# Altium integrated library Mastermind.IntLib: 985 symbols (part 3 of 6)
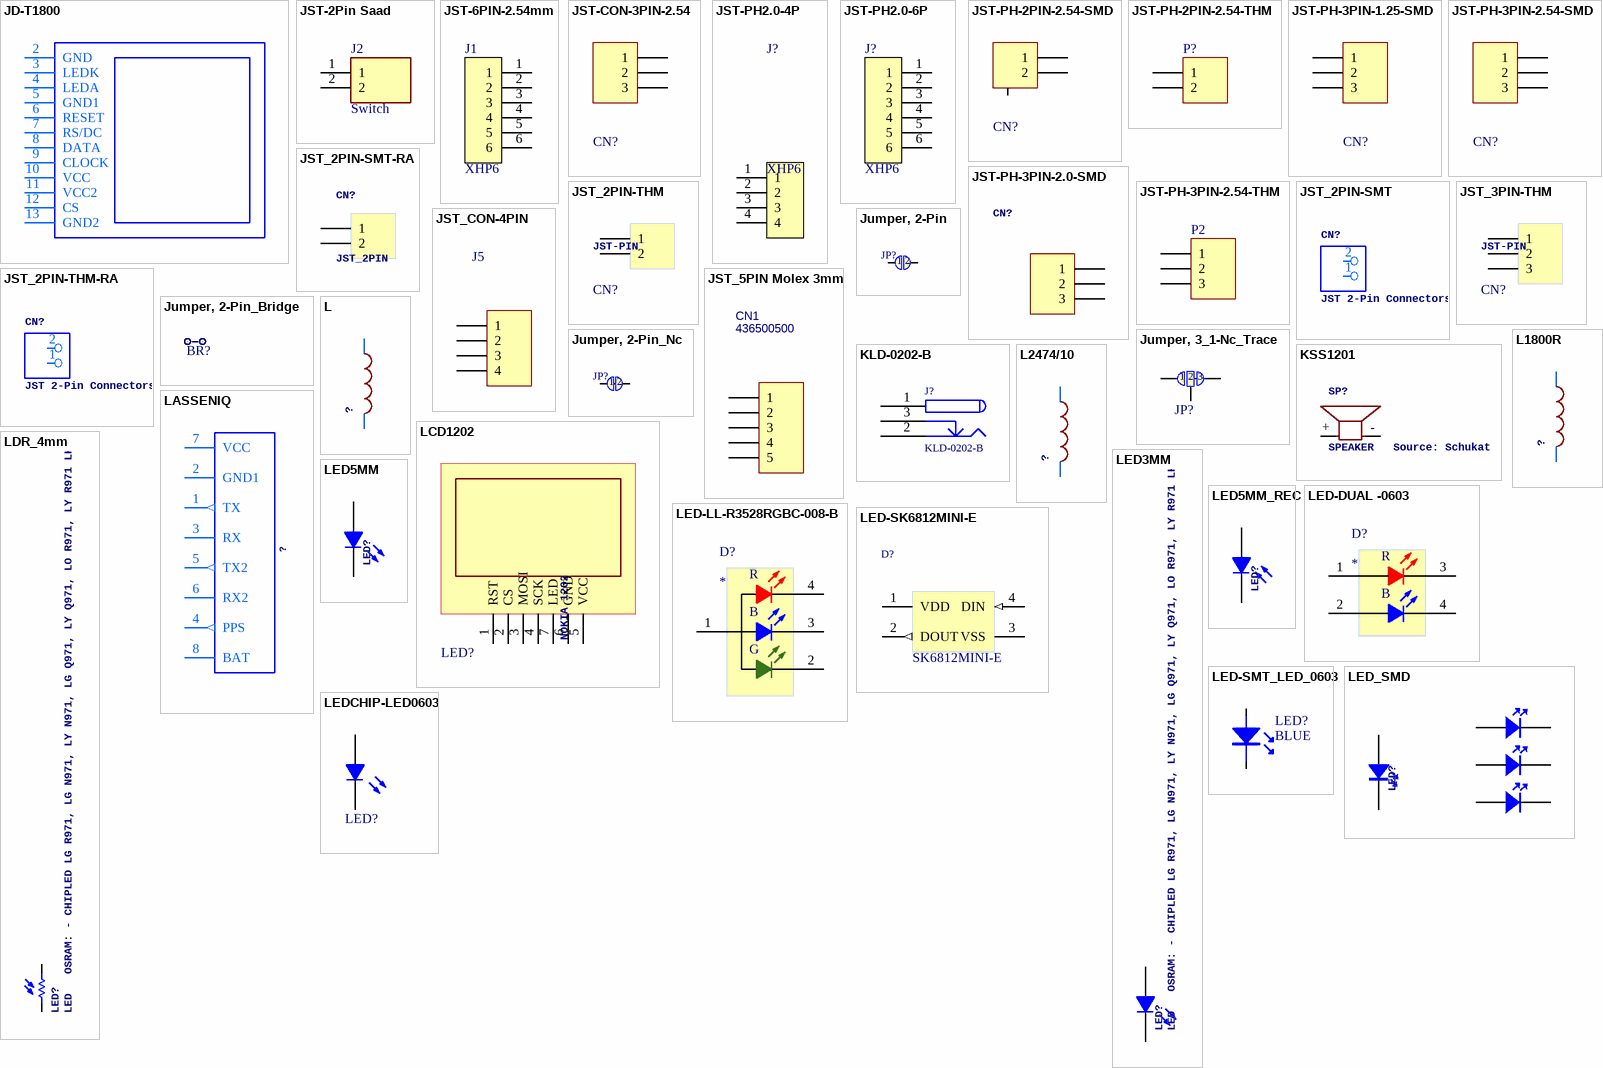
[diagram p42: symbols JD-T1800 to LEDCHIP-LED0603]

## Jumper, 2-Pin_Bridge
designator BR?  (value not drawn)  (no BOM)
Jumper, 2-Pin
signal-integrity model Connector
footprint JUMPER-NT
pins: 1, 2

## Jumper, 2-Pin_Nc
designator JP?, comment Shorting Link  (value not drawn)  (no BOM)
Jumper, 2-Pin
footprint Jumper-NC
pins: 1, 2

## Jumper, 3_1-Nc_Trace
designator JP?, comment JUMPER-SMT_3_1-NC_TRACE_NO-SILK  (value not drawn)  (no BOM)
GateName_1: G$1; SymbolName_1: SMT-JUMPER_3_1-NC_TRACE; DeviceName: _NO-SILK; LibraryName: SparkFun-Jumpers; DeviceSetName: JUMPER-SMT_3_1-NC_TRACE
footprint JUMPER_3_2-NC_TRACE_SILK (SMT-JUMPER_3_2-NC_TRACE_SILK)
pins: 1, 2, 3

## KLD-0202-B
designator J?
Low Voltage Power Supply Connector; Manufacturer: Kycon; AEMS Code: 3510211
3D model power_jack (PCB3D Model)
footprint KLD-0202
pins: 1 (power), 2 (power), 3 (power)

## KSS1201
designator SP?, comment SPEAKER   Source: Schukat
OC_FARNELL: unknown; OC_NEWARK: unknown
footprint KSS1201
pins: + 1, - 2

## L
designator ?
footprint 6000
pins: 1, 2

## L1800R
designator ?
footprint 1800R
pins: 1, 2

## L2474/10
designator ?
footprint 2747
pins: P$1 1, P$2 2

## LASSENIQ
designator ?
footprint TRIMBLE
pins: 1 TX (out), 2 GND1 (oe), 3 RX, 4 PPS (out), 5 TX2 (out), 6 RX2, 7 VCC (oe), 8 BAT (oe)

## LCD1202
designator LED?, comment NOKIA 1202
footprint LCD1202
pins: 1 RST, 2 CS, 3 MOSI, 4 SCK, 5 VCC, 6 GND, 7 LED

## LDR_4mm
designator LED?, comment LED   OSRAM: - CHIPLED LG R971, LG N971, LY N971, LG Q971, LY Q971, LO R971, LY R971 LH N974, LH R974 LS Q976, LO Q976, LY Q976 LO Q996 - Hyper CHIPLED LW Q18S LB Q993, LB Q99A, LB R99A - SideLED LS A670, LO A670, LY A670, LG A670, LP A670 LB A673, LV A673, LT A673, LW A673 LH A674 LY A675 LS A676, LA A676, LO A676, LY A676, LW A676 LS A679, LY A679, LG A679 -  Hyper Micro SIDELEDÂ® LS Y876, LA Y876, LO Y876, LY Y876 LT Y87S - SmartLED LW L88C, LW L88S LB L89C, LB L89S, LG L890 LS L89K, LO L89K, LY L89K LS L896, LA L896, LO L896, LY L896 - TOPLED LS T670, LO T670, LY T670, LG T670, LP T670 LSG T670, LSP T670, LSY T670, LOP T670, LYG T670 LG T671, LOG T671, LSG T671 LB T673, LV T673, LT T673, LW T673 LH T674 LS T676, LA T676, LO T676, LY T676, LB T676, LH T676, LSB T676, LW T676 LB T67C, LV T67C, LT T67C, LS T67K, LO T67K, LY T67K, LW E67C LS E67B, LA E67B, LO E67B, LY E67B, LB E67C, LV E67C, LT E67C LW T67C LS T679, LY T679, LG T679 LS T770, LO T770, LY T770, LG T770, LP T770 LB T773, LV T773, LT T773, LW T773 LH T774 LS E675, LA E675, LY E675, LS T675 LS T776, LA T776, LO T776, LY T776, LB T776 LHGB T686 LT T68C, LB T68C - Hyper Mini TOPLEDÂ® LB M676 - Mini TOPLED SantanaÂ® LG M470 LS M47K, LO M47K, LY M47K    Source: http://www.osram.convergy.de/
footprint LDR-4mm
pins: 1, 2

## LED3MM
designator LED?, comment LED   OSRAM: - CHIPLED LG R971, LG N971, LY N971, LG Q971, LY Q971, LO R971, LY R971 LH N974, LH R974 LS Q976, LO Q976, LY Q976 LO Q996 - Hyper CHIPLED LW Q18S LB Q993, LB Q99A, LB R99A - SideLED LS A670, LO A670, LY A670, LG A670, LP A670 LB A673, LV A673, LT A673, LW A673 LH A674 LY A675 LS A676, LA A676, LO A676, LY A676, LW A676 LS A679, LY A679, LG A679 -  Hyper Micro SIDELEDÂ® LS Y876, LA Y876, LO Y876, LY Y876 LT Y87S - SmartLED LW L88C, LW L88S LB L89C, LB L89S, LG L890 LS L89K, LO L89K, LY L89K LS L896, LA L896, LO L896, LY L896 - TOPLED LS T670, LO T670, LY T670, LG T670, LP T670 LSG T670, LSP T670, LSY T670, LOP T670, LYG T670 LG T671, LOG T671, LSG T671 LB T673, LV T673, LT T673, LW T673 LH T674 LS T676, LA T676, LO T676, LY T676, LB T676, LH T676, LSB T676, LW T676 LB T67C, LV T67C, LT T67C, LS T67K, LO T67K, LY T67K, LW E67C LS E67B, LA E67B, LO E67B, LY E67B, LB E67C, LV E67C, LT E67C LW T67C LS T679, LY T679, LG T679 LS T770, LO T770, LY T770, LG T770, LP T770 LB T773, LV T773, LT T773, LW T773 LH T774 LS E675, LA E675, LY E675, LS T675 LS T776, LA T776, LO T776, LY T776, LB T776 LHGB T686 LT T68C, LB T68C - Hyper Mini TOPLEDÂ® LB M676 - Mini TOPLED SantanaÂ® LG M470 LS M47K, LO M47K, LY M47K    Source: http://www.osram.convergy.de/
footprint LED3MM
pins: A, K

## LED5MM
designator LED?
footprint LED5MM
footprint LED5MM1
pins: A, K

## LED5MM_REC
designator LED?
footprint LED5MM
footprint LED5MM1
pins: A, K

## LED-DUAL -0603
designator D?
0603 1.6*1.5mm; MF: Lucky Light; MP: LL-R3528RGBC-008-B; Package: PLCC-2 Lucky Light; Availability: Unavailable; Value: *; SnapEDA_Link: https://www.snapeda.com/parts/LL-R3528RGBC-008-B/Lucky%20Light/view-part/47649/?ref=snap; Price: None
footprint LED_DUAL_0606 - touch
footprint LED_DUAL_0606
pins: 1 A, 2 A, 3 K, 4 K
text: R; B

## LED-LL-R3528RGBC-008-B
designator D?
LED; SMD; 3528, PLCC2; RGB; 3.5x2.8mm; 120Â°; Red lumin: 1; MF: Lucky Light; MP: LL-R3528RGBC-008-B; Package: PLCC-2 Lucky Light; Availability: Unavailable; Value: *; SnapEDA_Link: https://www.snapeda.com/parts/LL-R3528RGBC-008-B/Lucky%20Light/view-part/47649/?ref=snap; Price: None
footprint LED_LL-R3528RGBC-008-B
pins: 1 A, 2 K, 3 K, 4 K
text: R; B; G

## LED-SK6812MINI-E
designator D?  Name: SK6812MINI-E
SMD RGB LED
footprint LED_SK6812MINI-E
pins: 1 VDD, 2 DOUT (out), 3 VSS, 4 DIN (in)

## LED-SMT_LED_0603
designator LED?, comment BLUE
SMT LED
footprint CHIPLED_0603
pins: A, C K

## LED_SMD
designator LED?, comment LED   OSRAM: - CHIPLED LG R971, LG N971, LY N971, LG Q971, LY Q971, LO R971, LY R971 LH N974, LH R974 LS Q976, LO Q976, LY Q976 LO Q996 - Hyper CHIPLED LW Q18S LB Q993, LB Q99A, LB R99A - SideLED LS A670, LO A670, LY A670, LG A670, LP A670 LB A673, LV A673, LT A673, LW A673 LH A674 LY A675 LS A676, LA A676, LO A676, LY A676, LW A676 LS A679, LY A679, LG A679 -  Hyper Micro SIDELEDÂ® LS Y876, LA Y876, LO Y876, LY Y876 LT Y87S - SmartLED LW L88C, LW L88S LB L89C, LB L89S, LG L890 LS L89K, LO L89K, LY L89K LS L896, LA L896, LO L896, LY L896 - TOPLED LS T670, LO T670, LY T670, LG T670, LP T670 LSG T670, LSP T670, LSY T670, LOP T670, LYG T670 LG T671, LOG T671, LSG T671 LB T673, LV T673, LT T673, LW T673 LH T674 LS T676, LA T676, LO T676, LY T676, LB T676, LH T676, LSB T676, LW T676 LB T67C, LV T67C, LT T67C, LS T67K, LO T67K, LY T67K, LW E67C LS E67B, LA E67B, LO E67B, LY E67B, LB E67C, LV E67C, LT E67C LW T67C LS T679, LY T679, LG T679 LS T770, LO T770, LY T770, LG T770, LP T770 LB T773, LV T773, LT T773, LW T773 LH T774 LS E675, LA E675, LY E675, LS T675 LS T776, LA T776, LO T776, LY T776, LB T776 LHGB T686 LT T68C, LB T68C - Hyper Mini TOPLEDÂ® LB M676 - Mini TOPLED SantanaÂ® LG M470 LS M47K, LO M47K, LY M47K    Source: http://www.osram.convergy.de/  (value not drawn)
footprint CHIPLED_0603
pins: A, A, A, A, C K, C K, C K, C K

## LEDCHIP-LED0603
designator LED?, comment LED  (value not drawn)
SMD lamp beads
footprint CHIP-LED0603
footprint CHIPLED_0603
footprint KA-3528ASYC
footprint CHIPLED_0603 - NO
pins: A, C K

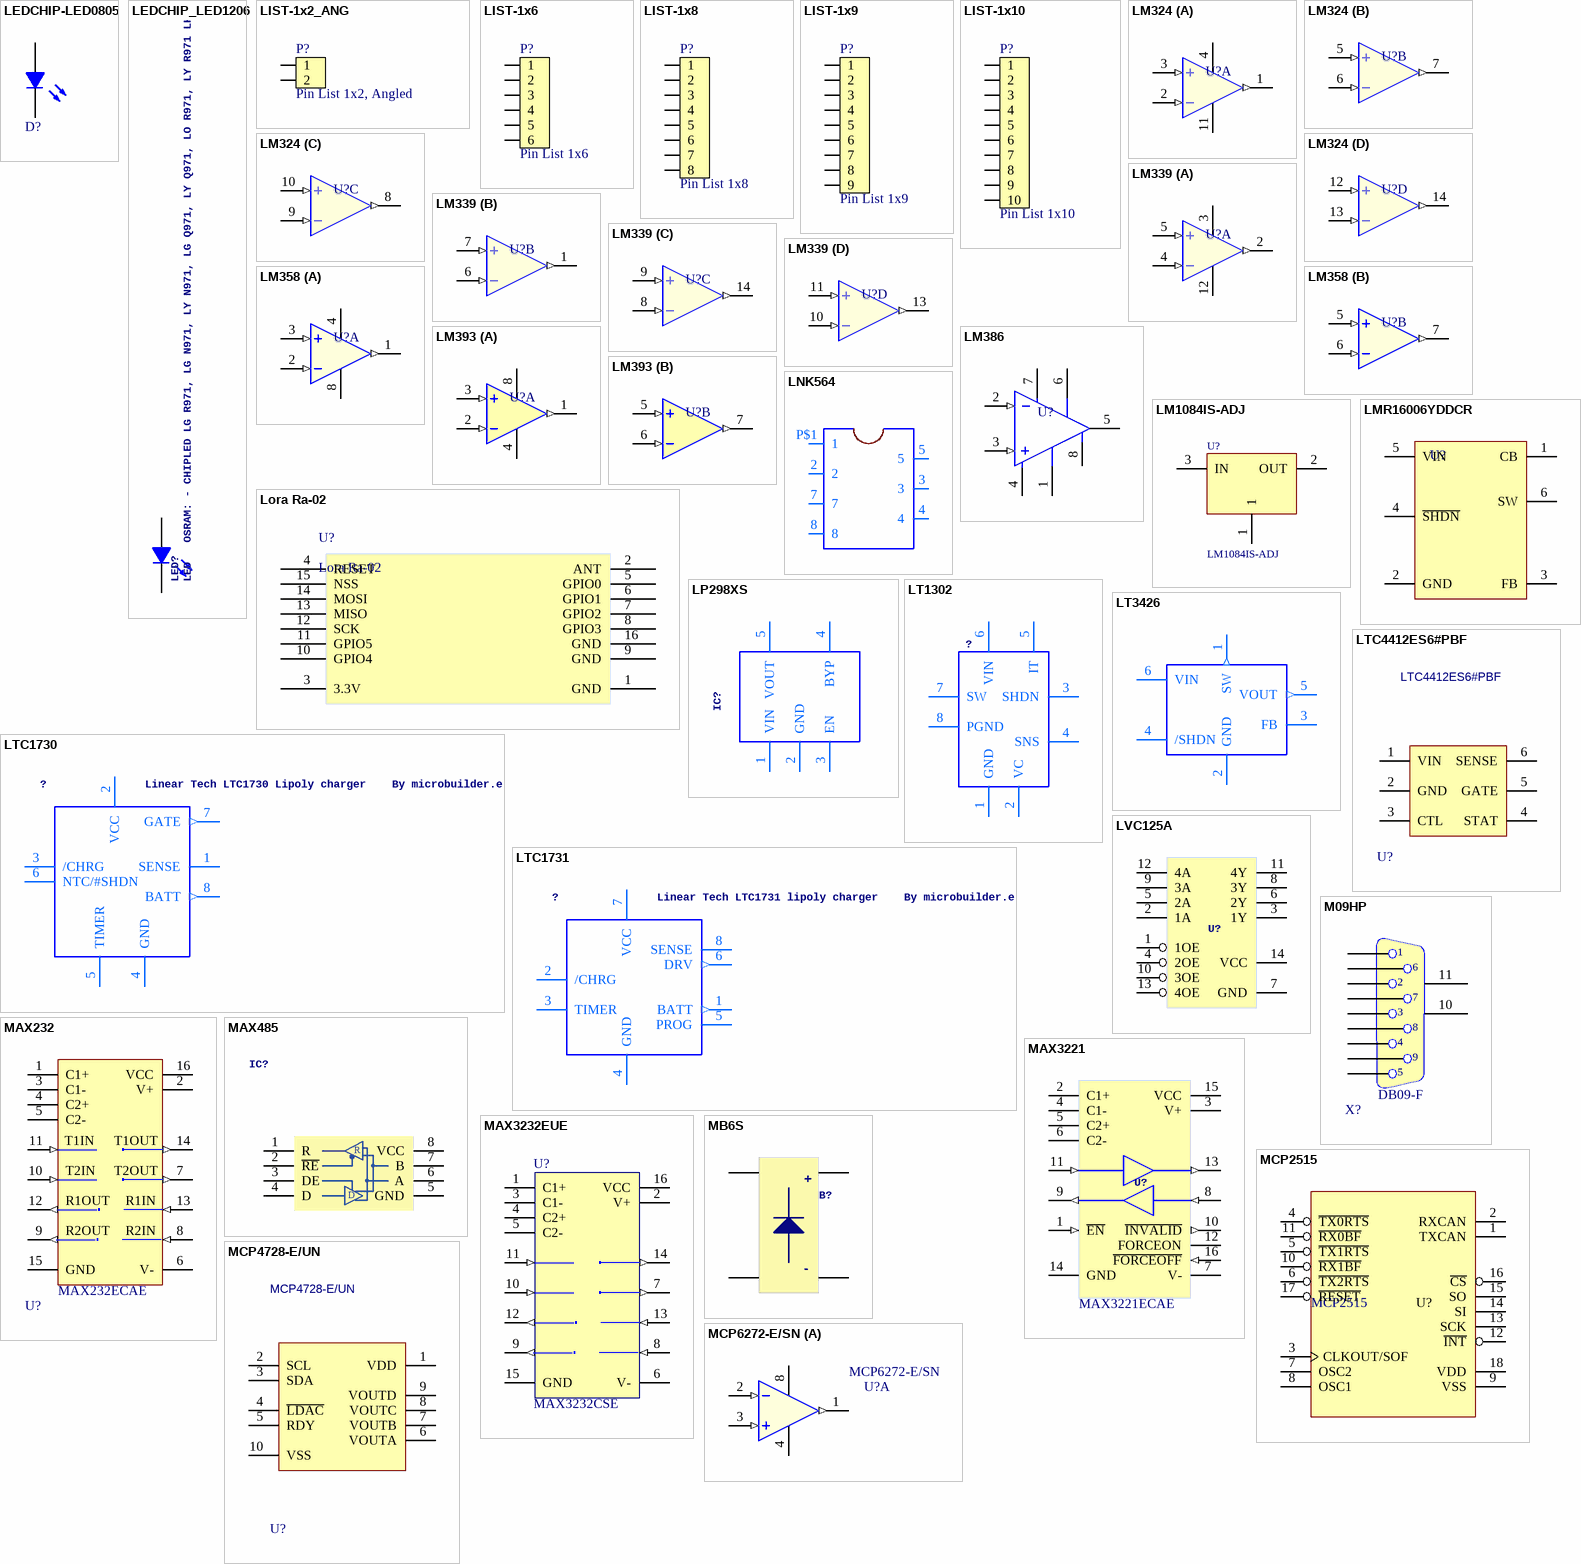
[diagram p16: symbols LEDCHIP-LED0805 to MCP6272-E/SN]

## LEDCHIP-LED0805
designator D?  (value not drawn)
SMD Lamp beads
footprint CHIP-LED0805
footprint CHIP-LED0805-NO
pins: A, C

## LEDCHIP_LED1206
designator LED?, comment LED   OSRAM: - CHIPLED LG R971, LG N971, LY N971, LG Q971, LY Q971, LO R971, LY R971 LH N974, LH R974 LS Q976, LO Q976, LY Q976 LO Q996 - Hyper CHIPLED LW Q18S LB Q993, LB Q99A, LB R99A - SideLED LS A670, LO A670, LY A670, LG A670, LP A670 LB A673, LV A673, LT A673, LW A673 LH A674 LY A675 LS A676, LA A676, LO A676, LY A676, LW A676 LS A679, LY A679, LG A679 -  Hyper Micro SIDELEDÂ® LS Y876, LA Y876, LO Y876, LY Y876 LT Y87S - SmartLED LW L88C, LW L88S LB L89C, LB L89S, LG L890 LS L89K, LO L89K, LY L89K LS L896, LA L896, LO L896, LY L896 - TOPLED LS T670, LO T670, LY T670, LG T670, LP T670 LSG T670, LSP T670, LSY T670, LOP T670, LYG T670 LG T671, LOG T671, LSG T671 LB T673, LV T673, LT T673, LW T673 LH T674 LS T676, LA T676, LO T676, LY T676, LB T676, LH T676, LSB T676, LW T676 LB T67C, LV T67C, LT T67C, LS T67K, LO T67K, LY T67K, LW E67C LS E67B, LA E67B, LO E67B, LY E67B, LB E67C, LV E67C, LT E67C LW T67C LS T679, LY T679, LG T679 LS T770, LO T770, LY T770, LG T770, LP T770 LB T773, LV T773, LT T773, LW T773 LH T774 LS E675, LA E675, LY E675, LS T675 LS T776, LA T776, LO T776, LY T776, LB T776 LHGB T686 LT T68C, LB T68C - Hyper Mini TOPLEDÂ® LB M676 - Mini TOPLED SantanaÂ® LG M470 LS M47K, LO M47K, LY M47K    Source: http://www.osram.convergy.de/
footprint CHIPLED_1206
pins: A, C

## LIST-1x2_ANG
designator P?, comment Pin List 1x2, Angled
Pin List 1x2, 2.54mm (100mil), Right Angled, SMD; Part Number: Pin List Ang 1x2 SMD, 2.54mm; Manufacturer: W-CON; Manufacturer Part Number: 1125B-1102S0ZZ135R1; 2nd source part number: TSM-102-01-L-SH-A; Artikkelnr Noca: 55010023; Artikkelnr Simpro: N.A.; Datasheet: \\hizz\pro\app9717\Datasheet\connectores\W-CON\1125B-11XXXXZXXXXX.pdf; Footprint Doc: LIST_ANG_1x2-SMD-2.54MM; LatestRevisionDate: 2016-01-22; Pin Count: 2; Publisher: Nordic Semiconductor; Published: 2016-01-22; Value: Pin List 1x2, Angled; Note: *; Supplier: Cabcon; Supplier part number: 1125B-1102S0ZZ135R1; 2nd source Supplier: Samtec
footprint LIST_ANG_1x2-SMD-2.54MM
pins: 1, 2

## LIST-1x6
designator P?, comment Pin List 1x6
Pin List 1x6, 2.54mm (100mil), SMD; Part Number: Pin List 1x6 SMD; Note: Not mounted; Artikkelnr Noca: 55019252; Artikkelnr Simpro: N.A.; Manufacturer: *; Manufacturer Part Number: *; Datasheet: *; LatestRevisionDate: 2013-08-27; Pin Count: 6; Publisher: Nordic Semiconductor; Published: 2013-08-27; Value: Pin List 1x6; Supplier: Samtec; Supplier part number: TSM-106-01-L-SV-P-TR; 2nd source Supplier: *; 2nd source part number: *; Footprint Doc: LIST_1x6_SMD
footprint LIST_1x6_SMD
pins: 1, 2, 3 (power), 4 (power), 5 (power), 6 (power)

## LIST-1x8
designator P?, comment Pin List 1x8
Pin List 1x8, 2.54mm (100mil), SMD; Part Number: Pin List 1x8 SMD; Note: Not mounted; Artikkelnr Noca: 55019253; Artikkelnr Simpro: N.A.; Manufacturer: *; Manufacturer Part Number: *; Datasheet: *; LatestRevisionDate: 2013-08-27; Publisher: Nordic Semiconductor; Published: 2013-08-27; Value: Pin List 1x8; Supplier: Samtec; Supplier part number: TSM-108-01-L-SV-P-TR; 2nd source Supplier: *; 2nd source part number: *; Pin Count: 8; Footprint Doc: LIST_1x8_SMD
footprint LIST_1x8_SMD
pins: 1, 2, 3 (power), 4 (power), 5 (power), 6 (power), 7 (power), 8 (power)

## LIST-1x9
designator P?, comment Pin List 1x9
Pin List 1x9, 2.54mm (100mil), SMD; Part Number: Pin List 1x9 SMD; Artikkelnr Noca: N.A.; Manufacturer: *; Manufacturer Part Number: *; Datasheet: *; Footprint Doc: LIST_1x9_SMD; LatestRevisionDate: 2014-06-10; Pin Count: 9; Publisher: Nordic Semiconductor; Published: 2014-06-10; Value: Pin List 1x9; Note: *; Supplier: Samtec; Supplier part number: TSM-109-01-L-SV-P-TR; 2nd source Supplier: *; 2nd source part number: *; Artikkelnr Simpro: N.A.
footprint LIST_1x9_SMD
pins: 1, 2, 3 (power), 4 (power), 5 (power), 6 (power), 7 (power), 8 (power), 9 (power)

## LIST-1x10
designator P?, comment Pin List 1x10
Pin List 1x10, 2.54mm (100mil), SMD; Part Number: Pin List 1x10 SMD; Note: Not mounted; Artikkelnr Noca: 55019254; Artikkelnr Simpro: N.A.; Manufacturer: *; Manufacturer Part Number: *; Datasheet: *; LatestRevisionDate: 2013-08-27; Publisher: Nordic Semiconductor; Published: 2013-08-27; Value: Pin List 1x10; Supplier: Samtec; Supplier part number: TSM-110-01-L-SV-P-TR; 2nd source Supplier: *; 2nd source part number: *; Pin Count: 10; Footprint Doc: LIST_1x10_SMD
footprint LIST_1x10_SMD
pins: 1, 2, 3, 4, 5, 6, 7, 8, 9, 10

## LM324
designator U?  (value not drawn)
Four channels 15nA 0.5V/us 1.2MHz SOIC-14 Operational Amplifier ROHS
footprint TSSOP14
footprint SOIC127P600X175-14N
part A pins: 1 OA (out), 2 A- (in), 3 A+ (in), 4 VCC, 11 GND
part B pins: 5 B+ (in), 6 B- (in), 7 OB (out)
part C pins: 8 OC (out), 9 C- (in), 10 C+ (in)
part D pins: 12 D+ (in), 13 D- (in), 14 OD (out)

## LM339
designator U?, comment National LM3622 li-ion charger    http://www.ladyada.net/library/eagle  (value not drawn)
footprint TSSOP14
part A pins: 2 OA (out), 3 VCC, 4 A- (in), 5 A+ (in), 12 GND
part B pins: 1 OB (out), 6 B- (in), 7 B+ (in)
part C pins: 8 C- (in), 9 C+ (in), 14 OC (out)
part D pins: 10 D- (in), 11 D+ (in), 13 OD (out)

## LM358
designator U?  (value not drawn)
Dual Operational Amplifiers
footprint SOIC-8E (SOIC, 8-Leads, Body 4.90x3.90mm, Pitch 1.27mm, IPC Medium Density)
footprint DIL08-ROUND
part A pins: 1 OA (out), 2 A- (in), 3 A+ (in), 4 GND, 8 VCC
part B pins: 5 B+ (in), 6 B- (in), 7 OB (out)

## LM386
designator U?  (value not drawn)
Audio Amplifiers
footprint SOIC-8E (SOIC, 8-Leads, Body 4.90x3.90mm, Pitch 1.27mm, IPC Medium Density)
footprint DIL08-ROUND
pins: 1 OA, 2 A- (in), 3 A+ (in), 4 GND, 5 VCC, 6 VCC, 7 VCC, 8 VCC

## LM393
designator U?, comment LM393 OP AMP  (value not drawn)
Operational Amplifier
footprint SOP8
footprint DIL08-ROUND
part A pins: 1 OA (out), 2 A- (in), 3 A+ (in), 4 GND, 8 VCC
part B pins: 5 B+ (in), 6 B- (in), 7 OB (out)

## LM1084IS-ADJ
designator U?
5A Low Dropout Possitive Regulators
footprint TO-263
3D model to263 (PCB3D Model)
pins: 1 "Output", 2 OUT (power) "Output", 3 IN (power) "Input"

## LMR16006YDDCR
designator U?  (value not drawn)
BOM_Manufacturer: TI(Tex as Instruments); Contributor: LCSC; BOM_Supplier: LCSC; BOM_Supplier Part: C290195; BOM_Manufacturer Part: LMR16006YDDCR; BOM_JLCPCB Part Class: Extended Part; spicePre: U; spiceSymbolName: LMR16006YDDCR
footprint SOT23-6
pins: 1 CB, 2 GND, 3 FB, 4 ~{SHDN}, 5 VIN, 6 SW

## LNK564
designator ?
footprint LNKPACKAGE
pins: 2, 3, 4, 5, 7, 8, P$1 1

## Lora Ra-02
designator U?
Lora Technology; IC: ESP8266-EX; Vendor: Ai-thinker; LatestReviewer: Zion Blue; Published: 14-Apr-2015; Publisher: Cynetik Group; LatestRevisionData: 14-Apr-2015; LatestRevisionNote: Include 3D body and Footprint
footprint Ra-02 (Lora module)
pins: 1 GND "Reset", 2 ANT "ADC Input Or TOUT Output", 3 3.3V "Chip enable", 4 RESET "GPIO16 or Deep-Sleep Wakeup", 5 GPIO0 "GPIO14 or SPI CLK", 6 GPIO1 "GPIO12 or SPIQ", 7 GPIO2 "GPIO13 or SPID", 8 GPIO3 "Power supply", 9 GND "Power ground", 10 GPIO4 "GPIO15 or SPICS", 11 GPIO5 "GPIO2 or TX", 12 SCK "GPIO0 or SPICS2", 13 MISO "GPIO5", 14 MOSI "GPIO4", 15 NSS "GPIO3 or UART RXD", 16 GND "GPIO1 or UART TXD"

## LP298XS
designator IC?
footprint SOT23-5L
pins: 1 VIN, 2 GND, 3 EN, 4 BYP, 5 VOUT

## LT1302
designator ?
footprint DIL08
pins: 1 GND, 2 VC, 3 SHDN, 4 SNS, 5 IT, 6 VIN, 7 SW, 8 PGND

## LT3426
designator ?, comment LT3426   1.2MHz, 2A boost converter in SOT-23    http://www.linear.com/pc/productDetail.jsp?navId=H0,C1,C1003,C1042,C1031,C1061,P8430 (Linear website)  (value not drawn)
footprint SOT23-6
pins: 1 SW (out), 2 GND (oe), 3 FB, 4 /SHDN, 5 VOUT (out), 6 VIN

## LTC1730
designator ?, comment Linear Tech LTC1730 Lipoly charger    By microbuilder.eu
footprint SO08
pins: 1 SENSE, 2 VCC (oe), 3 /CHRG, 4 GND (oe), 5 TIMER, 6 NTC/#SHDN, 7 GATE (out), 8 BATT (out)

## LTC1731
designator ?, comment Linear Tech LTC1731 lipoly charger    By microbuilder.eu
footprint SO08
pins: 1 BATT (out), 2 /CHRG, 3 TIMER, 4 GND (oe), 5 PROG, 6 DRV (out), 7 VCC (oe), 8 SENSE

## LTC4412ES6#PBF
designator U?
Manufacturer: ADI(亚德诺); Supplier: LCSC; Manufacturer Part: LTC4412ES6#PBF; Supplier Part: C107968; JLCPCB Part Class: Extended Part; spicePre: U; spiceSymbolName: LTC4412ES6#PBF
footprint SOT23-6
pins: 1 VIN, 2 GND, 3 CTL, 4 STAT, 5 GATE, 6 SENSE

## LVC125A
designator U?, comment Quad_shift_level_ic  (value not drawn)
74VHC125MCT
footprint TSSOP14
pins: 1 1OE, 2 1A, 3 1Y, 4 2OE, 5 2A, 6 2Y, 7 GND, 8 3Y, 9 3A, 10 3OE, 11 4Y, 12 4A, 13 4OE, 14 VCC

## M09HP
designator X?, comment SUB-D  (value not drawn)
GateName_1: G$1; SymbolName_1: F09; DeviceName: H; LibraryName: con-subd; DeviceSetName: F09; Package: F09H; OC_FARNELL: unknown; OC_NEWARK: unknown
footprint M09HP
pins: 1, 2, 3, 4, 5, 6, 7, 8, 9, 10 1, 11 1
text: DB09-F

## MAX232
designator U?, comment SymbolName_1: MAX232ECAE  (hidden comment: RS232 TRANSCEIVER)
GateName_1: G$1
footprint SO-16
pins: 1 C1+, 2 V+ (power), 3 C1-, 4 C2+, 5 C2-, 6 V- (power), 7 T2OUT (out), 8 R2IN (in), 9 R2OUT (out), 10 T2IN (in), 11 T1IN (in), 12 R1OUT (out), 13 R1IN (in), 14 T1OUT (out), 15 GND (power), 16 VCC (power)

## MAX485
designator IC?  (value not drawn)
RS-485/RS-422 ICs ROHS
footprint SOP8
pins: 1 R, 2 ~{RE}, 3 DE, 4 D, 5 GND (power), 6 A, 7 B (power), 8 VCC (power)

## MAX3221
designator U?, comment SymbolName_1: MAX3221ECAE  (hidden comment: RS232 TRANSCEIVER)
GateName_1: G$1
footprint SSOP16
pins: 1 ~{EN} (in), 2 C1+, 3 V+, 4 C1-, 5 C2+, 6 C2-, 7 V-, 8 (in), 9 (out), 10 ~{INVALID} (out), 11 (in), 12 FORCEON, 13 (out), 14 GND, 15 VCC, 16 ~{FORCEOFF} (in)

## MAX3232EUE
designator U?, comment MAX3232CSE
3.0V TO 5.5V, Low-Power, up to 1Mbps, True RS-232 Transceiver Using Four 0.1µF External Capacitor; Manufacturer: Maxim,ST; Package Information: Latest Revision: 21-0066 C; Class I: Communication; Published: 16-Jan-2001; Revision: July-2002: Re-released for DXP Platform.; Datasheet: Latest Revision: Mar-1999; Package Reference: TSSOP16; Publisher: Altium Limited; Class II: Transceiver; Fitted: True
footprint SO-16
pins: 1 C1+, 2 V+ (power), 3 C1-, 4 C2+, 5 C2-, 6 V- (power), 7 T2OUT (out), 8 R2IN (in), 9 R2OUT (out), 10 T2IN (in), 11 T1IN (in), 12 R1OUT (out), 13 R1IN (in), 14 T1OUT (out), 15 GND (power), 16 VCC (power)

## MB6S
designator B?
footprint MBS
pins: +, -, AC1, AC2

## MCP2515
designator U?
CAN Controller; Manufacturer: Tokmas(托克马斯); Symbol: MCP2515-I; Add into BOM: yes; Device: MCP2515-I; Supplier: LCSC; Supplier Part: C5250735; Manufacturer Part: MCP2515-I; JLCPCB Part Class: Extended Part; LCSC Part Name: CAN芯片; Supplier Footprint: TSSOP-20; Datasheet: https://atta.szlcsc.com/upload/public/pdf/source/20221108/54102364C5045B746FF767DA10992A5D.pdf; Convert to PCB: yes
footprint SOIC-18_L11.6-W7.5-P1.27-LS10.3-BL
pins: 1 TXCAN, 2 RXCAN, 3 CLKOUT/SOF, 4 ~{TX0RTS}, 5 ~{TX1RTS}, 6 ~{TX2RTS}, 7 OSC2, 8 OSC1, 9 VSS, 10 ~{RX1BF}, 11 ~{RX0BF}, 12 ~{INT}, 13 SCK, 14 SI, 15 SO, 16 ~{CS}, 17 ~{RESET}, 18 VDD

## MCP4728-E/UN
designator U?
12Bit MSOP-10 Digital To Analog Converters (DACs); Manufacturer: MICROCHIP(美国微芯); Contributor: LCSC; Supplier: LCSC; Supplier Part: C108207; Manufacturer Part: MCP4728-E/UN; JLCPCB Part Class: Extended Part; spicePre: U; spiceSymbolName: MCP4728-E/UN
footprint MSOP-10_L3.0-W3.0-P0.50-LS5.0-TL
pins: 1 VDD, 2 SCL, 3 SDA, 4 ~{LDAC}, 5 RDY, 6 VOUTA, 7 VOUTB, 8 VOUTC, 9 VOUTD, 10 VSS

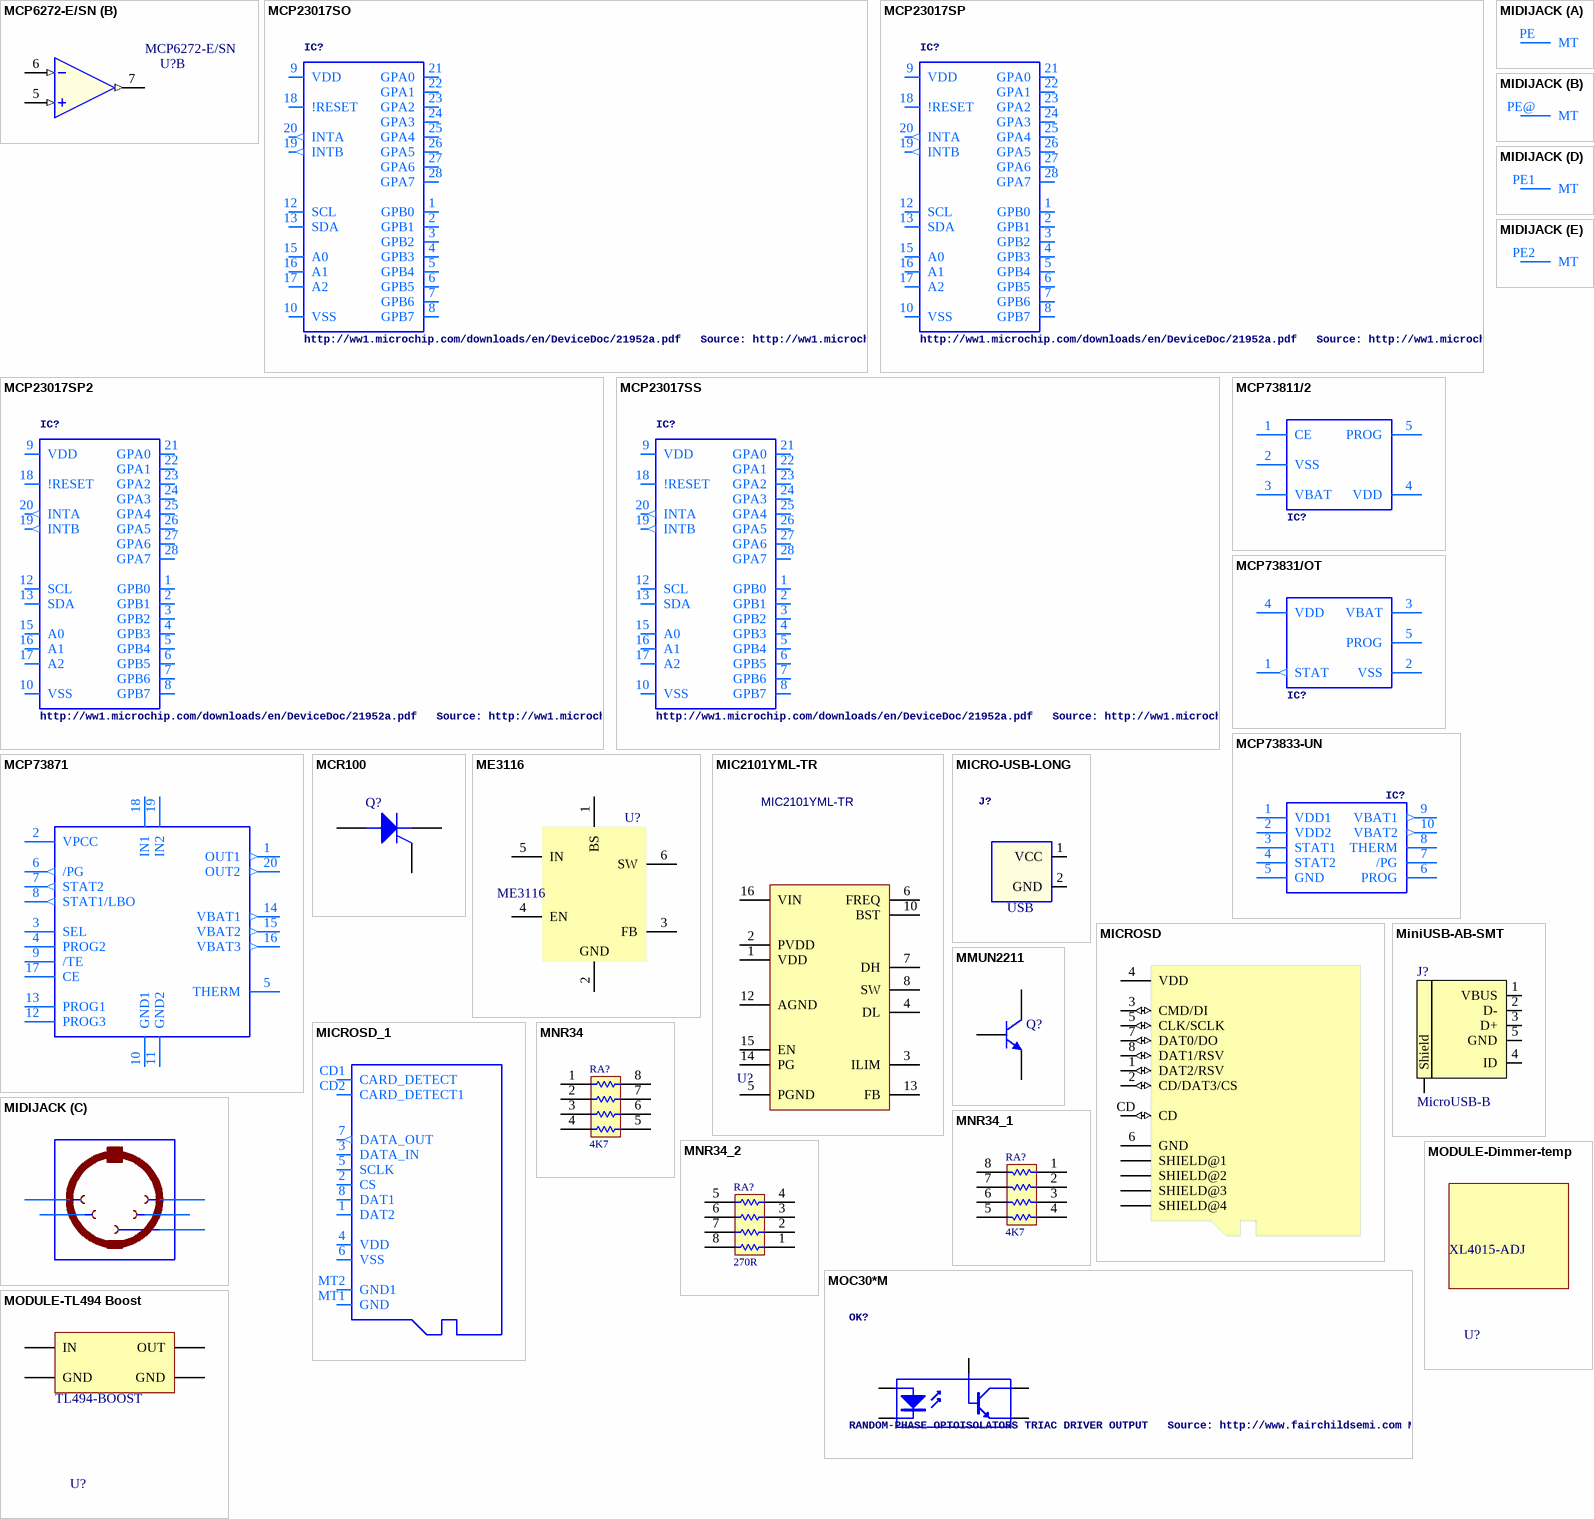
[diagram p17: symbols MCP6272-E/SN to MODULE-TL494 Boost]

## MCP6272-E/SN
designator U?
Manufacturer: MICROCHIP(美国微芯); Add into BOM: yes; Number of Circuits: 双路; Gain Bandwidth Product(GBP): 2MHz; Current - Input Bias(Ib): 1pA; Slew Rate(SR): 0.9V/us; Output Current: 25mA; Symbol: MCP6272-E/SN; Device: MCP6272-E/SN; LCSC Part Name: MCP6272-E/SN; Supplier Part: C636301; Manufacturer Part: MCP6272-E/SN; Supplier Footprint: SOIC-8; JLCPCB Part Class: Extended Part; Datasheet: https://atta.szlcsc.com/upload/public/pdf/source/20200417/C515535_72B2759F45DBE71254DBF0F155102EE1.pdf; Supplier: LCSC; Convert to PCB: yes; -3db Bandwidth: -; Output Type: -; Rail to Rail: -; Operating Temperature: -40℃~+125℃
footprint SOIC-8_L4.9-W3.9-P1.27-LS6.0-BL
3D model SOIC-8_L4.9-W3.9-H1.7-LS6.0-P1.27
part A pins: 1 OA (out), 2 A- (in), 3 A+ (in), 4 GND, 8 VCC
part B pins: 5 B+ (in), 6 B- (in), 7 OB (out)

## MCP23017SO
designator IC?, comment http://ww1.microchip.com/downloads/en/DeviceDoc/21952a.pdf   Source: http://ww1.microchip.com/downloads/en/DeviceDoc/21952a.pdf
footprint SO28W
pins: 1 GPB0, 2 GPB1, 3 GPB2, 4 GPB3, 5 GPB4, 6 GPB5, 7 GPB6, 8 GPB7, 9 VDD (power), 10 VSS (power), 12 SCL, 13 SDA, 15 A0, 16 A1, 17 A2, 18 !RESET, 19 INTB (out), 20 INTA (out), 21 GPA0, 22 GPA1, 23 GPA2, 24 GPA3, 25 GPA4, 26 GPA5, 27 GPA6, 28 GPA7

## MCP23017SP
designator IC?, comment http://ww1.microchip.com/downloads/en/DeviceDoc/21952a.pdf   Source: http://ww1.microchip.com/downloads/en/DeviceDoc/21952a.pdf
footprint DIL28-3
pins: 1 GPB0, 2 GPB1, 3 GPB2, 4 GPB3, 5 GPB4, 6 GPB5, 7 GPB6, 8 GPB7, 9 VDD (power), 10 VSS (power), 12 SCL, 13 SDA, 15 A0, 16 A1, 17 A2, 18 !RESET, 19 INTB (out), 20 INTA (out), 21 GPA0, 22 GPA1, 23 GPA2, 24 GPA3, 25 GPA4, 26 GPA5, 27 GPA6, 28 GPA7

## MCP23017SP2
designator IC?, comment http://ww1.microchip.com/downloads/en/DeviceDoc/21952a.pdf   Source: http://ww1.microchip.com/downloads/en/DeviceDoc/21952a.pdf
footprint DIL28-3-ROUND
pins: 1 GPB0, 2 GPB1, 3 GPB2, 4 GPB3, 5 GPB4, 6 GPB5, 7 GPB6, 8 GPB7, 9 VDD (power), 10 VSS (power), 12 SCL, 13 SDA, 15 A0, 16 A1, 17 A2, 18 !RESET, 19 INTB (out), 20 INTA (out), 21 GPA0, 22 GPA1, 23 GPA2, 24 GPA3, 25 GPA4, 26 GPA5, 27 GPA6, 28 GPA7

## MCP23017SS
designator IC?, comment http://ww1.microchip.com/downloads/en/DeviceDoc/21952a.pdf   Source: http://ww1.microchip.com/downloads/en/DeviceDoc/21952a.pdf
footprint SSOP28
pins: 1 GPB0, 2 GPB1, 3 GPB2, 4 GPB3, 5 GPB4, 6 GPB5, 7 GPB6, 8 GPB7, 9 VDD (power), 10 VSS (power), 12 SCL, 13 SDA, 15 A0, 16 A1, 17 A2, 18 !RESET, 19 INTB (out), 20 INTA (out), 21 GPA0, 22 GPA1, 23 GPA2, 24 GPA3, 25 GPA4, 26 GPA5, 27 GPA6, 28 GPA7

## MCP73811/2
designator IC?, comment MCP73811 and MCP73812   Simple, Miniature Single-Cell, Fully Integrated Li-Ion / Li-Polymer Charge Management Controllers  SOT-23-5 package, no indicator LED but with adjustable current, small and very inexpensive  (value not drawn)
footprint SOT23-5L
pins: 1 CE, 2 VSS (power), 3 VBAT, 4 VDD (power), 5 PROG

## MCP73831/OT
designator IC?, comment MCP73831/2   Miniature Single-Cell, Fully Integrated Li-Ion, Li-Polymer Charge Management Controllers.    Nice and small simple lipoly charge controller, with adjustable current and status output (LED)    http://www.ladyada.net/library/pcb/eaglelibrary.html  (value not drawn)
footprint SOT23-5L
pins: 1 STAT (out), 2 VSS (power), 3 VBAT, 4 VDD (power), 5 PROG

## MCP73833-UN
designator IC?
footprint MSOP10
pins: 1 VDD1 (power), 2 VDD2 (power), 3 STAT1, 4 STAT2, 5 GND (power), 6 PROG, 7 /PG, 8 THERM, 9 VBAT1 (out), 10 VBAT2 (out)

## MCP73871
designator IC?
footprint QFN20
pins: 1 OUT1 (out), 2 VPCC, 3 SEL, 4 PROG2, 5 THERM, 6 /PG (out), 7 STAT2 (out), 8 STAT1/LBO (out), 9 /TE, 10 GND1 (power), 11 GND2 (power), 12 PROG3, 13 PROG1, 14 VBAT1 (out), 15 VBAT2 (out), 16 VBAT3 (out), 17 CE, 18 IN1, 19 IN2, 20 OUT2 (out)

## MCR100
designator Q?
Silicon Controlled Rectifier; Published: 8-Jun-2000; LatestRevisionDate: 17-Jul-2002; LatestRevisionNote: Re-released for DXP Platform.; PackageReference: TO-220-AB; Publisher: Altium Limited; Code_JEDEC: TO-220-AB
simulation model SCR (Spice Subcircuit)
footprint SOT23
pins: 1 K, 2 G, 3 A

## ME3116
designator U?
Step-down type 1A 4.75V~40V SOT-23-6 DC-DC Converters ROHS
footprint SOT23-6
pins: 1 BS (power), 2 GND, 3 FB, 4 EN (power), 5 IN, 6 SW

## MIC2101YML-TR
designator U?
DC-DC Converters MLF-16; Manufacturer: MICROCHIP(美国微芯); Contributor: lcsc; Supplier: LCSC; Supplier Part: C621528; Manufacturer Part: MIC2101YML-TR; spicePre: U; spiceSymbolName: MIC2101YML-TR
footprint VQFN-16_L3.0-W3.0-P0.50-BL-EP1.7
pins: 1 VDD, 2 PVDD, 3 ILIM, 4 DL, 5 PGND, 6 FREQ, 7 DH, 8 SW, 9 GND hidden to GND, 10 BST, 11 GND hidden to GND, 12 AGND, 13 FB, 14 PG, 15 EN, 16 VIN, 17 GND hidden to GND

## MICRO-USB-LONG
designator J?
GateName_1: G$1; SymbolName_1: MICRO-USB-LONG; LibraryName: microusb; DeviceSetName: MICRO-USB-LONG; Package: MICRO_USB_LONG
footprint MICRO_USB_LONG
pins: 1 VCC (power), 2 GND (power)
text: USB

## MICROSD
designator ?, comment Micro-SD / Transflash card holder with SPI pinout   For the 3M # 2908-05WB-MG and/or 4UCON #19656 push-push type  (value not drawn)
GateName_1: G$1; DeviceSetName: MICROSD; SymbolName_1: TRANSFLASH; LibraryName: micro-sd; Package: C12075
footprint C12075
pins: 1 DAT2/RSV (io), 2 CD/DAT3/CS (io), 3 CMD/DI (io), 4 VDD (power), 5 CLK/SCLK (io), 6 GND (power), 7 DAT0/DO (io), 8 DAT1/RSV (io), CD (io), GND@1 SHIELD@1 (power), GND@2 SHIELD@2 (power), GND@3 SHIELD@3 (power), GND@4 SHIELD@4 (power)

## MICROSD_1
designator ?, comment Micro-SD / Transflash card holder with SPI pinout   For the 3M # 2908-05WB-MG and/or 4UCON #19656 push-push type  (value not drawn)
footprint MICROSD
pins: 1 DAT2, 2 CS, 3 DATA_IN, 4 VDD (oe), 5 SCLK, 6 VSS (oe), 7 DATA_OUT (out), 8 DAT1, CD1 CARD_DETECT, CD2 CARD_DETECT1, MT1 GND (oe), MT2 GND1 (oe)

## MIDIJACK
designator ?, comment DIN 5 jack also known as MIDI jackA modification of conn-hirshman:MAB5SH with two options for the grounding 'teeth'  (value not drawn)
footprint CP-2350
part A pins: PE MT
part B pins: PE@ MT
part C pins: 1, 2, 3, 4, 5
part D pins: PE1 MT
part E pins: PE2 MT

## MiniUSB-AB-SMT
designator J?, comment MicroUSB-B
MicroUSB-B-SMT; Part Number: USB-Micro-B-RA-SMD-PiP; Manufacturer: Allen Creations Corp.; Manufacturer Part Number: AJU55-BS2111-L; 2nd source part number: 609-4616-1-ND; Artikkelnr Noca: 55029020; Artikkelnr Simpro: N.A.; Datasheet: \\hizz\pro\app9717\Datasheet\connectores\Allen Creations Corp\AJU-211.pdf; Footprint Doc: USB-Micro-B-RA-SMD-PiP; LatestRevisionDate: 2016-04-21; Pin Count: 5; Publisher: Nordic Semiconductor; Published: 2014-10-07; Value: MicroUSB-B; Note: *; Supplier: Cabcon; Supplier part number: AJU55-BS2111-L; 2nd source Supplier: Digi-Key
footprint USB-Micro-B-RA-SMD-PiP
pins: 1 VBUS (power), 2 D-, 3 D+, 4 ID, 5 GND (power), 6 Shield (power)

## MMUN2211
designator Q?
NPN Bipolar Transistor; Published: 8-Jun-2000; LatestRevisionDate: 17-Jul-2002; LatestRevisionNote: Re-released for DXP Platform.; PackageReference: TO-226-AA; Publisher: Altium Limited; PackageDescription: TO, Flat Index; 3 In-Line, Axial Leads; Body Dia. 4.8mm; Leads 0.55 x 0.51 mm (max); Code_JEDEC: TO-226-AA
simulation model NPN
signal-integrity model NPN
footprint SOT23
pins: 1 B, 2 E, 3 C

## MNR34
designator RA?, comment 4K7
3216x4 Resistor Array; AEMS Code: 1300330
footprint MNR34
footprint MNR34T
pins: 1, 2, 3, 4, 5, 6, 7, 8

## MNR34_1
designator RA?, comment 4K7
3216x4 Resistor Array; AEMS Code: 1300330
footprint MNR34
footprint MNR34T
pins: 1, 2, 3, 4, 5, 6, 7, 8

## MNR34_2
designator RA?, comment 270R
3216x4 Resistor Array; AEMS Code: 1310010
footprint MNR34
pins: 1, 2, 3, 4, 5, 6, 7, 8

## MOC30*M
designator OK?, comment RANDOM-PHASE OPTOISOLATORS TRIAC DRIVER OUTPUT   Source: http://www.fairchildsemi.com MOC3020-M.pdf
footprint DIL06F
pins: 1 A "Anode", 2 K "Cathode", 4 C "Collector", 5 B "Base", 6 E "Emitter"

## MODULE-Dimmer-temp
designator U?
footprint MODULE-dimmmer-temp
text: XL4015-ADJ

## MODULE-TL494 Boost
designator U?
footprint MODULE-TL494
pins: 1 IN, 2 GND, 3 OUT, 4 GND
text: TL494-BOOST

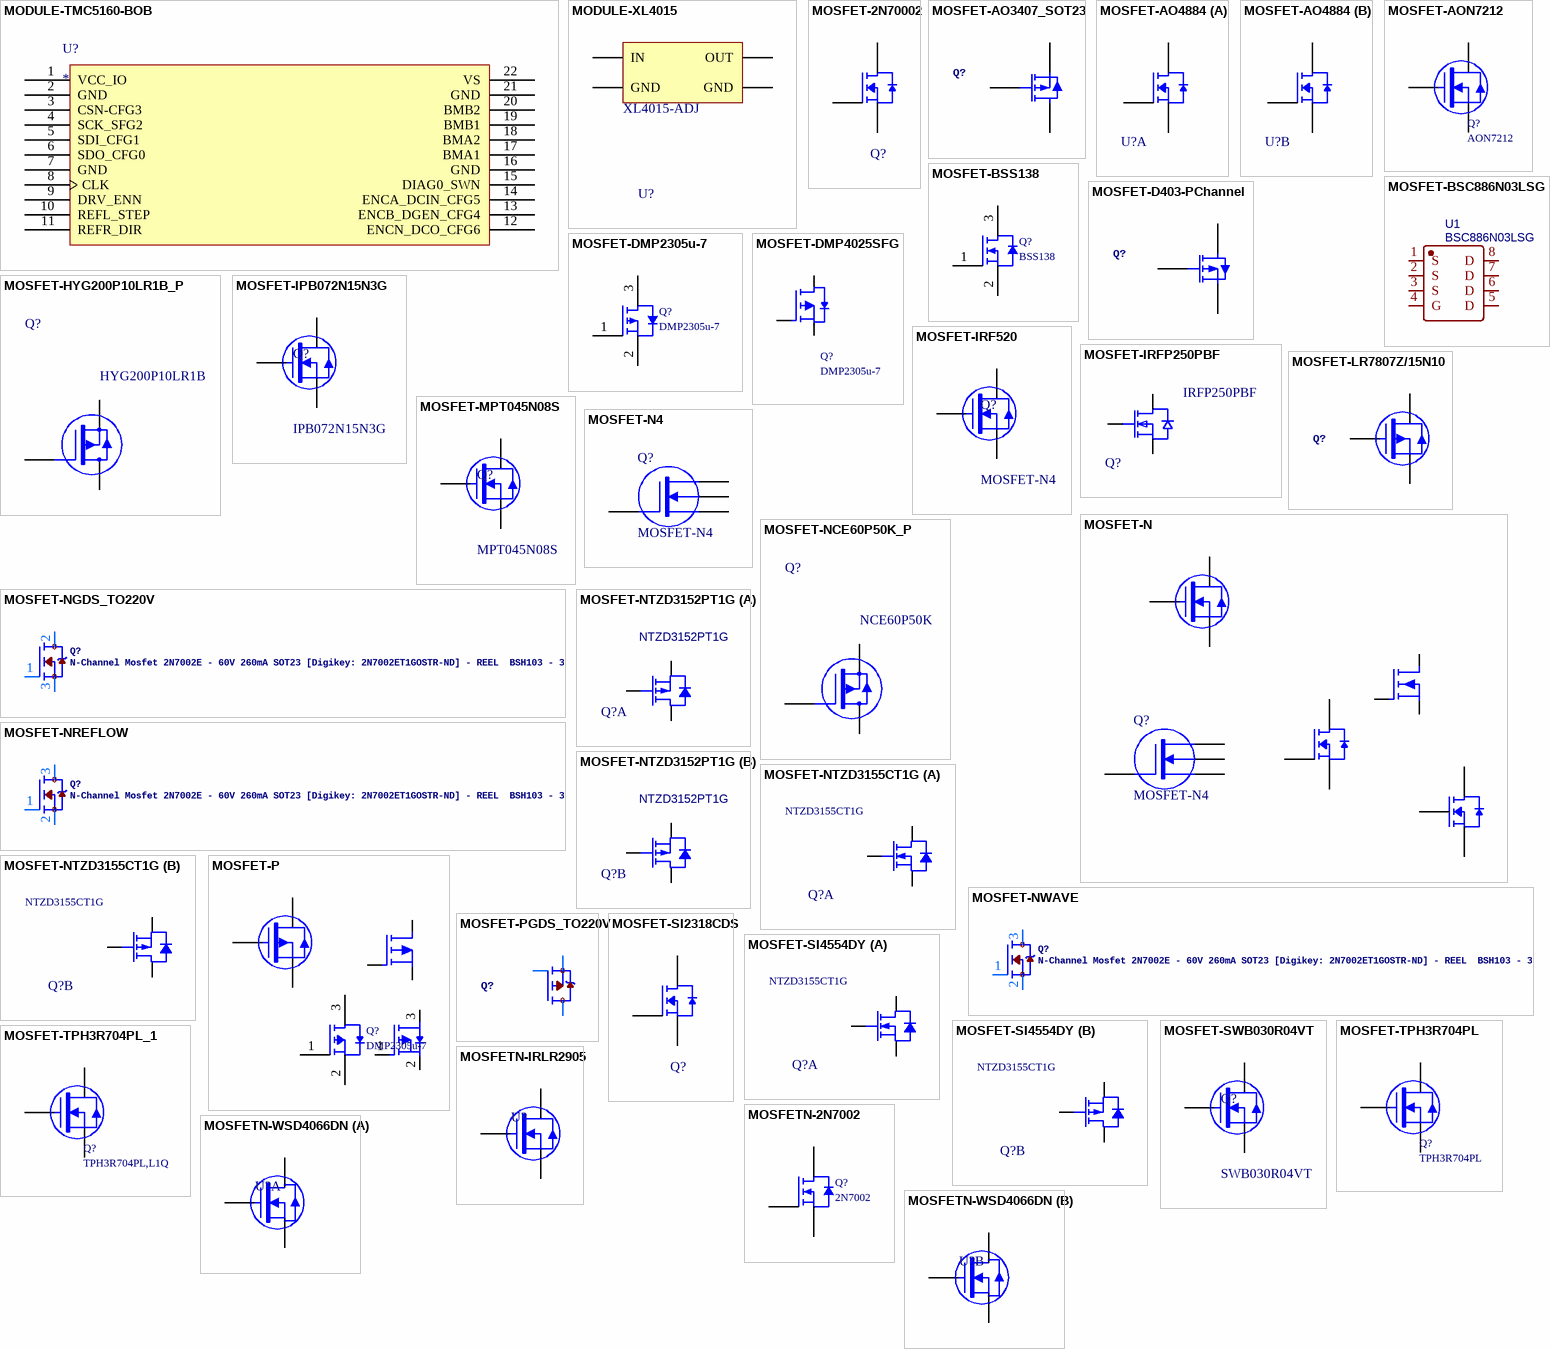
[diagram p18: symbols MODULE-TMC5160-BOB to MOSFETN-WSD4066DN]
